# Altium schematic symbol library jlcpcb_2025_04_capacitors_extended_0402.schlib: 3594 symbols (part 11 of 20) (continued)
## CQ0402BRNPO9BN1R9
designator C?  Capacitance: 1.9pF  (hidden comment: *)
Capacitor, Ceramic (MLCC), 1.9pF, 50V, NP0, SMD 0402; Manufacturer: YAGEO; Manufacturer Part Number: CQ0402BRNPO9BN1R9; Package Size: 0402; JLCPCB Basic Part: No; JLCPCB Part Number: C1855155; Supplier 1: LCSC; Category: Capacitors - MLCC; Supplier Part Number 1: C1855155; Voltage Rating: 50V; Temperature Coefficient: NP0; RoHS: Yes; ComponentLink1Description: Datasheet; ComponentLink1URL: https://wmsc.lcsc.com/wmsc/upload/file/pdf/v2/lcsc/2201271230_YAGEO-CQ0402BRNPO9BN1R9_C1855155.pdf; ComponentLink2Description: JLCPCB Part URL; ComponentLink2URL: https://jlcpcb.com/partdetail/C1855155; ComponentLink3Description: LCSC Part URL; ComponentLink3URL: https://lcsc.com/product-detail/Multilayer-Ceramic-Capacitors-MLCC---SMD-SMT_YAGEO-YAGEO-CQ0402BRNPO9BN1R9_C1855155.html
footprint CAP-0402 (0402 (1005M) Capacitor)
pins: 1, 2

## CQ0402BRNPO9BN2R1
designator C?  Capacitance: 2.1pF  (hidden comment: *)
Capacitor, Ceramic (MLCC), 2.1pF, 50V, C0G, SMD 0402; Manufacturer: YAGEO; Manufacturer Part Number: CQ0402BRNPO9BN2R1; Package Size: 0402; JLCPCB Basic Part: No; JLCPCB Part Number: C3891310; Supplier 1: LCSC; Category: Capacitors - MLCC; Supplier Part Number 1: C3891310; Voltage Rating: 50V; Temperature Coefficient: C0G; RoHS: Yes; ComponentLink1Description: Datasheet; ComponentLink1URL: https://wmsc.lcsc.com/wmsc/upload/file/pdf/v2/lcsc/2311211124_YAGEO-CQ0402BRNPO9BN2R1_C3891310.pdf; ComponentLink2Description: JLCPCB Part URL; ComponentLink2URL: https://jlcpcb.com/partdetail/C3891310; ComponentLink3Description: LCSC Part URL; ComponentLink3URL: https://lcsc.com/product-detail/Multilayer-Ceramic-Capacitors-MLCC---SMD-SMT_YAGEO-YAGEO-CQ0402BRNPO9BN2R1_C3891310.html
footprint CAP-0402 (0402 (1005M) Capacitor)
pins: 1, 2

## CQ0402BRNPO9BN2R2
designator C?  Capacitance: 2.2pF  (hidden comment: *)
Capacitor, Ceramic (MLCC), 2.2pF, 50V, NP0, SMD 0402; Manufacturer: YAGEO; Manufacturer Part Number: CQ0402BRNPO9BN2R2; Package Size: 0402; JLCPCB Basic Part: No; JLCPCB Part Number: C577375; Supplier 1: LCSC; Category: Capacitors - MLCC; Supplier Part Number 1: C577375; Voltage Rating: 50V; Temperature Coefficient: NP0; RoHS: Yes; ComponentLink1Description: Datasheet; ComponentLink1URL: https://wmsc.lcsc.com/wmsc/upload/file/pdf/v2/lcsc/2201041830_YAGEO-CQ0402BRNPO9BN2R2_C577375.pdf; ComponentLink2Description: JLCPCB Part URL; ComponentLink2URL: https://jlcpcb.com/partdetail/C577375; ComponentLink3Description: LCSC Part URL; ComponentLink3URL: https://lcsc.com/product-detail/Multilayer-Ceramic-Capacitors-MLCC---SMD-SMT_YAGEO-YAGEO-CQ0402BRNPO9BN2R2_C577375.html
footprint CAP-0402 (0402 (1005M) Capacitor)
pins: 1, 2

## CQ0402BRNPO9BN2R3
designator C?  Capacitance: 2.3pF  (hidden comment: *)
Capacitor, Ceramic (MLCC), 2.3pF, 50V, C0G, SMD 0402; Manufacturer: YAGEO; Manufacturer Part Number: CQ0402BRNPO9BN2R3; Package Size: 0402; JLCPCB Basic Part: No; JLCPCB Part Number: C3842756; Supplier 1: LCSC; Category: Capacitors - MLCC; Supplier Part Number 1: C3842756; Voltage Rating: 50V; Temperature Coefficient: C0G; RoHS: Yes; ComponentLink1Description: Datasheet; ComponentLink1URL: https://wmsc.lcsc.com/wmsc/upload/file/pdf/v2/lcsc/2311211124_YAGEO-CQ0402BRNPO9BN2R3_C3842756.pdf; ComponentLink2Description: JLCPCB Part URL; ComponentLink2URL: https://jlcpcb.com/partdetail/C3842756; ComponentLink3Description: LCSC Part URL; ComponentLink3URL: https://lcsc.com/product-detail/Multilayer-Ceramic-Capacitors-MLCC---SMD-SMT_YAGEO-YAGEO-CQ0402BRNPO9BN2R3_C3842756.html
footprint CAP-0402 (0402 (1005M) Capacitor)
pins: 1, 2

## CQ0402BRNPO9BN2R4
designator C?  Capacitance: 2.4pF  (hidden comment: *)
Capacitor, Ceramic (MLCC), 2.4pF, 50V, NP0, SMD 0402; Manufacturer: YAGEO; Manufacturer Part Number: CQ0402BRNPO9BN2R4; Package Size: 0402; JLCPCB Basic Part: No; JLCPCB Part Number: C577376; Supplier 1: LCSC; Category: Capacitors - MLCC; Supplier Part Number 1: C577376; Voltage Rating: 50V; Temperature Coefficient: NP0; RoHS: Yes; ComponentLink1Description: Datasheet; ComponentLink1URL: https://wmsc.lcsc.com/wmsc/upload/file/pdf/v2/lcsc/2207011200_YAGEO-CQ0402BRNPO9BN2R4_C577376.pdf; ComponentLink2Description: JLCPCB Part URL; ComponentLink2URL: https://jlcpcb.com/partdetail/C577376; ComponentLink3Description: LCSC Part URL; ComponentLink3URL: https://lcsc.com/product-detail/Multilayer-Ceramic-Capacitors-MLCC---SMD-SMT_YAGEO-YAGEO-CQ0402BRNPO9BN2R4_C577376.html
footprint CAP-0402 (0402 (1005M) Capacitor)
pins: 1, 2

## CQ0402BRNPO9BN2R6
designator C?  Capacitance: 2.6pF  (hidden comment: *)
Capacitor, Ceramic (MLCC), 2.6pF, 50V, NP0, SMD 0402; Manufacturer: YAGEO; Manufacturer Part Number: CQ0402BRNPO9BN2R6; Package Size: 0402; JLCPCB Basic Part: No; JLCPCB Part Number: C1855279; Supplier 1: LCSC; Category: Capacitors - MLCC; Supplier Part Number 1: C1855279; Voltage Rating: 50V; Temperature Coefficient: NP0; RoHS: Yes; ComponentLink1Description: Datasheet; ComponentLink1URL: https://wmsc.lcsc.com/wmsc/upload/file/pdf/v2/lcsc/2201271230_YAGEO-CQ0402BRNPO9BN2R6_C1855279.pdf; ComponentLink2Description: JLCPCB Part URL; ComponentLink2URL: https://jlcpcb.com/partdetail/C1855279; ComponentLink3Description: LCSC Part URL; ComponentLink3URL: https://lcsc.com/product-detail/Multilayer-Ceramic-Capacitors-MLCC---SMD-SMT_YAGEO-YAGEO-CQ0402BRNPO9BN2R6_C1855279.html
footprint CAP-0402 (0402 (1005M) Capacitor)
pins: 1, 2

## CQ0402BRNPO9BN3R0
designator C?  Capacitance: 3pF  (hidden comment: *)
Capacitor, Ceramic (MLCC), 3pF, 50V, NP0, SMD 0402; Manufacturer: YAGEO; Manufacturer Part Number: CQ0402BRNPO9BN3R0; Package Size: 0402; JLCPCB Basic Part: No; JLCPCB Part Number: C577378; Supplier 1: LCSC; Category: Capacitors - MLCC; Supplier Part Number 1: C577378; Voltage Rating: 50V; Temperature Coefficient: NP0; RoHS: Yes; ComponentLink1Description: Datasheet; ComponentLink1URL: https://wmsc.lcsc.com/wmsc/upload/file/pdf/v2/lcsc/2203221230_YAGEO-CQ0402BRNPO9BN3R0_C577378.pdf; ComponentLink2Description: JLCPCB Part URL; ComponentLink2URL: https://jlcpcb.com/partdetail/C577378; ComponentLink3Description: LCSC Part URL; ComponentLink3URL: https://lcsc.com/product-detail/Multilayer-Ceramic-Capacitors-MLCC---SMD-SMT_YAGEO-YAGEO-CQ0402BRNPO9BN3R0_C577378.html
footprint CAP-0402 (0402 (1005M) Capacitor)
pins: 1, 2

## CQ0402BRNPO9BN3R1
designator C?  Capacitance: 3.1pF  (hidden comment: *)
Capacitor, Ceramic (MLCC), 3.1pF, 50V, NP0, SMD 0402; Manufacturer: YAGEO; Manufacturer Part Number: CQ0402BRNPO9BN3R1; Package Size: 0402; JLCPCB Basic Part: No; JLCPCB Part Number: C1855283; Supplier 1: LCSC; Category: Capacitors - MLCC; Supplier Part Number 1: C1855283; Voltage Rating: 50V; Temperature Coefficient: NP0; RoHS: Yes; ComponentLink1Description: Datasheet; ComponentLink1URL: https://wmsc.lcsc.com/wmsc/upload/file/pdf/v2/lcsc/2201271230_YAGEO-CQ0402BRNPO9BN3R1_C1855283.pdf; ComponentLink2Description: JLCPCB Part URL; ComponentLink2URL: https://jlcpcb.com/partdetail/C1855283; ComponentLink3Description: LCSC Part URL; ComponentLink3URL: https://lcsc.com/product-detail/Multilayer-Ceramic-Capacitors-MLCC---SMD-SMT_YAGEO-YAGEO-CQ0402BRNPO9BN3R1_C1855283.html
footprint CAP-0402 (0402 (1005M) Capacitor)
pins: 1, 2

## CQ0402BRNPO9BN3R3
designator C?  Capacitance: 3.3pF  (hidden comment: *)
Capacitor, Ceramic (MLCC), 3.3pF, 50V, NP0, SMD 0402; Manufacturer: YAGEO; Manufacturer Part Number: CQ0402BRNPO9BN3R3; Package Size: 0402; JLCPCB Basic Part: No; JLCPCB Part Number: C326071; Supplier 1: LCSC; Category: Capacitors - MLCC; Supplier Part Number 1: C326071; Voltage Rating: 50V; Temperature Coefficient: NP0; RoHS: Yes; ComponentLink1Description: Datasheet; ComponentLink1URL: https://wmsc.lcsc.com/wmsc/upload/file/pdf/v2/lcsc/1811070918_YAGEO-CQ0402BRNPO9BN3R3_C326071.pdf; ComponentLink2Description: JLCPCB Part URL; ComponentLink2URL: https://jlcpcb.com/partdetail/C326071; ComponentLink3Description: LCSC Part URL; ComponentLink3URL: https://lcsc.com/product-detail/Multilayer-Ceramic-Capacitors-MLCC---SMD-SMT_YAGEO-YAGEO-CQ0402BRNPO9BN3R3_C326071.html
footprint CAP-0402 (0402 (1005M) Capacitor)
pins: 1, 2

## CQ0402BRNPO9BN3R4
designator C?  Capacitance: 3.4pF  (hidden comment: *)
Capacitor, Ceramic (MLCC), 3.4pF, 50V, C0G, SMD 0402; Manufacturer: YAGEO; Manufacturer Part Number: CQ0402BRNPO9BN3R4; Package Size: 0402; JLCPCB Basic Part: No; JLCPCB Part Number: C3903353; Supplier 1: LCSC; Category: Capacitors - MLCC; Supplier Part Number 1: C3903353; Voltage Rating: 50V; Temperature Coefficient: C0G; RoHS: Yes; ComponentLink1Description: Datasheet; ComponentLink1URL: https://wmsc.lcsc.com/wmsc/upload/file/pdf/v2/lcsc/2311211124_YAGEO-CQ0402BRNPO9BN3R4_C3903353.pdf; ComponentLink2Description: JLCPCB Part URL; ComponentLink2URL: https://jlcpcb.com/partdetail/C3903353; ComponentLink3Description: LCSC Part URL; ComponentLink3URL: https://lcsc.com/product-detail/Multilayer-Ceramic-Capacitors-MLCC---SMD-SMT_YAGEO-YAGEO-CQ0402BRNPO9BN3R4_C3903353.html
footprint CAP-0402 (0402 (1005M) Capacitor)
pins: 1, 2

## CQ0402BRNPO9BN3R9
designator C?  Capacitance: 3.9pF  (hidden comment: *)
Capacitor, Ceramic (MLCC), 3.9pF, 50V, NP0, SMD 0402; Manufacturer: YAGEO; Manufacturer Part Number: CQ0402BRNPO9BN3R9; Package Size: 0402; JLCPCB Basic Part: No; JLCPCB Part Number: C577379; Supplier 1: LCSC; Category: Capacitors - MLCC; Supplier Part Number 1: C577379; Voltage Rating: 50V; Temperature Coefficient: NP0; RoHS: Yes; ComponentLink1Description: Datasheet; ComponentLink1URL: https://wmsc.lcsc.com/wmsc/upload/file/pdf/v2/lcsc/2203081130_YAGEO-CQ0402BRNPO9BN3R9_C577379.pdf; ComponentLink2Description: JLCPCB Part URL; ComponentLink2URL: https://jlcpcb.com/partdetail/C577379; ComponentLink3Description: LCSC Part URL; ComponentLink3URL: https://lcsc.com/product-detail/Multilayer-Ceramic-Capacitors-MLCC---SMD-SMT_YAGEO-YAGEO-CQ0402BRNPO9BN3R9_C577379.html
footprint CAP-0402 (0402 (1005M) Capacitor)
pins: 1, 2

## CQ0402BRNPO9BN4R2
designator C?  Capacitance: 4.2pF  (hidden comment: *)
Capacitor, Ceramic (MLCC), 4.2pF, 50V, NP0, SMD 0402; Manufacturer: YAGEO; Manufacturer Part Number: CQ0402BRNPO9BN4R2; Package Size: 0402; JLCPCB Basic Part: No; JLCPCB Part Number: C1855289; Supplier 1: LCSC; Category: Capacitors - MLCC; Supplier Part Number 1: C1855289; Voltage Rating: 50V; Temperature Coefficient: NP0; RoHS: Yes; ComponentLink1Description: Datasheet; ComponentLink1URL: https://wmsc.lcsc.com/wmsc/upload/file/pdf/v2/lcsc/2201271230_YAGEO-CQ0402BRNPO9BN4R2_C1855289.pdf; ComponentLink2Description: JLCPCB Part URL; ComponentLink2URL: https://jlcpcb.com/partdetail/C1855289; ComponentLink3Description: LCSC Part URL; ComponentLink3URL: https://lcsc.com/product-detail/Multilayer-Ceramic-Capacitors-MLCC---SMD-SMT_YAGEO-YAGEO-CQ0402BRNPO9BN4R2_C1855289.html
footprint CAP-0402 (0402 (1005M) Capacitor)
pins: 1, 2

## CQ0402BRNPO9BN4R5
designator C?  Capacitance: 4.5pF  (hidden comment: *)
Capacitor, Ceramic (MLCC), 4.5pF, 50V, NP0, SMD 0402; Manufacturer: YAGEO; Manufacturer Part Number: CQ0402BRNPO9BN4R5; Package Size: 0402; JLCPCB Basic Part: No; JLCPCB Part Number: C1855284; Supplier 1: LCSC; Category: Capacitors - MLCC; Supplier Part Number 1: C1855284; Voltage Rating: 50V; Temperature Coefficient: NP0; RoHS: Yes; ComponentLink1Description: Datasheet; ComponentLink1URL: https://wmsc.lcsc.com/wmsc/upload/file/pdf/v2/lcsc/2201271230_YAGEO-CQ0402BRNPO9BN4R5_C1855284.pdf; ComponentLink2Description: JLCPCB Part URL; ComponentLink2URL: https://jlcpcb.com/partdetail/C1855284; ComponentLink3Description: LCSC Part URL; ComponentLink3URL: https://lcsc.com/product-detail/Multilayer-Ceramic-Capacitors-MLCC---SMD-SMT_YAGEO-YAGEO-CQ0402BRNPO9BN4R5_C1855284.html
footprint CAP-0402 (0402 (1005M) Capacitor)
pins: 1, 2

## CQ0402BRNPO9BN4R9
designator C?  Capacitance: 4.9pF  (hidden comment: *)
Capacitor, Ceramic (MLCC), 4.9pF, 50V, NP0, SMD 0402; Manufacturer: YAGEO; Manufacturer Part Number: CQ0402BRNPO9BN4R9; Package Size: 0402; JLCPCB Basic Part: No; JLCPCB Part Number: C1855285; Supplier 1: LCSC; Category: Capacitors - MLCC; Supplier Part Number 1: C1855285; Voltage Rating: 50V; Temperature Coefficient: NP0; RoHS: Yes; ComponentLink1Description: Datasheet; ComponentLink1URL: https://wmsc.lcsc.com/wmsc/upload/file/pdf/v2/lcsc/2201271230_YAGEO-CQ0402BRNPO9BN4R9_C1855285.pdf; ComponentLink2Description: JLCPCB Part URL; ComponentLink2URL: https://jlcpcb.com/partdetail/C1855285; ComponentLink3Description: LCSC Part URL; ComponentLink3URL: https://lcsc.com/product-detail/Multilayer-Ceramic-Capacitors-MLCC---SMD-SMT_YAGEO-YAGEO-CQ0402BRNPO9BN4R9_C1855285.html
footprint CAP-0402 (0402 (1005M) Capacitor)
pins: 1, 2

## CQ0402BRNPO9BN5R0
designator C?  Capacitance: 5pF  (hidden comment: *)
Capacitor, Ceramic (MLCC), 5pF, null, NP0, SMD 0402; Manufacturer: YAGEO; Manufacturer Part Number: CQ0402BRNPO9BN5R0; Package Size: 0402; JLCPCB Basic Part: No; JLCPCB Part Number: C577383; Supplier 1: LCSC; Category: Capacitors - MLCC; Supplier Part Number 1: C577383; Voltage Rating: null; Temperature Coefficient: NP0; RoHS: Yes; ComponentLink1Description: Datasheet; ComponentLink1URL: https://wmsc.lcsc.com/wmsc/upload/file/pdf/v2/lcsc/2211211800_YAGEO-CQ0402BRNPO9BN5R0_C577383.pdf; ComponentLink2Description: JLCPCB Part URL; ComponentLink2URL: https://jlcpcb.com/partdetail/C577383; ComponentLink3Description: LCSC Part URL; ComponentLink3URL: https://lcsc.com/product-detail/Multilayer-Ceramic-Capacitors-MLCC---SMD-SMT_YAGEO-YAGEO-CQ0402BRNPO9BN5R0_C577383.html
footprint CAP-0402 (0402 (1005M) Capacitor)
pins: 1, 2

## CQ0402BRNPO9BNR10
designator C?  Capacitance: 0.1pF  (hidden comment: *)
Capacitor, Ceramic (MLCC), 0.1pF, 50V, NP0, SMD 0402; Manufacturer: YAGEO; Manufacturer Part Number: CQ0402BRNPO9BNR10; Package Size: 0402; JLCPCB Basic Part: No; JLCPCB Part Number: C1855094; Supplier 1: LCSC; Category: Capacitors - MLCC; Supplier Part Number 1: C1855094; Voltage Rating: 50V; Temperature Coefficient: NP0; RoHS: Yes; ComponentLink1Description: Datasheet; ComponentLink1URL: https://wmsc.lcsc.com/wmsc/upload/file/pdf/v2/lcsc/2201271230_YAGEO-CQ0402BRNPO9BNR10_C1855094.pdf; ComponentLink2Description: JLCPCB Part URL; ComponentLink2URL: https://jlcpcb.com/partdetail/C1855094; ComponentLink3Description: LCSC Part URL; ComponentLink3URL: https://lcsc.com/product-detail/Multilayer-Ceramic-Capacitors-MLCC---SMD-SMT_YAGEO-YAGEO-CQ0402BRNPO9BNR10_C1855094.html
footprint CAP-0402 (0402 (1005M) Capacitor)
pins: 1, 2

## CQ0402BRNPO9BNR30
designator C?  Capacitance: 0.3pF  (hidden comment: *)
Capacitor, Ceramic (MLCC), 0.3pF, 50V, NP0, SMD 0402; Manufacturer: YAGEO; Manufacturer Part Number: CQ0402BRNPO9BNR30; Package Size: 0402; JLCPCB Basic Part: No; JLCPCB Part Number: C723570; Supplier 1: LCSC; Category: Capacitors - MLCC; Supplier Part Number 1: C723570; Voltage Rating: 50V; Temperature Coefficient: NP0; RoHS: Yes; ComponentLink1Description: Datasheet; ComponentLink1URL: https://wmsc.lcsc.com/wmsc/upload/file/pdf/v2/lcsc/2008171333_YAGEO-CQ0402BRNPO9BNR30_C723570.pdf; ComponentLink2Description: JLCPCB Part URL; ComponentLink2URL: https://jlcpcb.com/partdetail/C723570; ComponentLink3Description: LCSC Part URL; ComponentLink3URL: https://lcsc.com/product-detail/Multilayer-Ceramic-Capacitors-MLCC---SMD-SMT_YAGEO-YAGEO-CQ0402BRNPO9BNR30_C723570.html
footprint CAP-0402 (0402 (1005M) Capacitor)
pins: 1, 2

## CQ0402BRNPO9BNR40
designator C?  Capacitance: 0.4pF  (hidden comment: *)
Capacitor, Ceramic (MLCC), 0.4pF, 50V, NP0, SMD 0402; Manufacturer: YAGEO; Manufacturer Part Number: CQ0402BRNPO9BNR40; Package Size: 0402; JLCPCB Basic Part: No; JLCPCB Part Number: C1855078; Supplier 1: LCSC; Category: Capacitors - MLCC; Supplier Part Number 1: C1855078; Voltage Rating: 50V; Temperature Coefficient: NP0; RoHS: Yes; ComponentLink1Description: Datasheet; ComponentLink1URL: https://wmsc.lcsc.com/wmsc/upload/file/pdf/v2/lcsc/2201271230_YAGEO-CQ0402BRNPO9BNR40_C1855078.pdf; ComponentLink2Description: JLCPCB Part URL; ComponentLink2URL: https://jlcpcb.com/partdetail/C1855078; ComponentLink3Description: LCSC Part URL; ComponentLink3URL: https://lcsc.com/product-detail/Multilayer-Ceramic-Capacitors-MLCC---SMD-SMT_YAGEO-YAGEO-CQ0402BRNPO9BNR40_C1855078.html
footprint CAP-0402 (0402 (1005M) Capacitor)
pins: 1, 2

## CQ0402BRNPO9BNR70
designator C?  Capacitance: 0.7pF  (hidden comment: *)
Capacitor, Ceramic (MLCC), 0.7pF, 50V, NP0, SMD 0402; Manufacturer: YAGEO; Manufacturer Part Number: CQ0402BRNPO9BNR70; Package Size: 0402; JLCPCB Basic Part: No; JLCPCB Part Number: C469633; Supplier 1: LCSC; Category: Capacitors - MLCC; Supplier Part Number 1: C469633; Voltage Rating: 50V; Temperature Coefficient: NP0; RoHS: Yes; ComponentLink1Description: Datasheet; ComponentLink1URL: https://wmsc.lcsc.com/wmsc/upload/file/pdf/v2/lcsc/2311211124_YAGEO-CQ0402BRNPO9BNR70_C469633.pdf; ComponentLink2Description: JLCPCB Part URL; ComponentLink2URL: https://jlcpcb.com/partdetail/C469633; ComponentLink3Description: LCSC Part URL; ComponentLink3URL: https://lcsc.com/product-detail/Multilayer-Ceramic-Capacitors-MLCC---SMD-SMT_YAGEO-YAGEO-CQ0402BRNPO9BNR70_C469633.html
footprint CAP-0402 (0402 (1005M) Capacitor)
pins: 1, 2

## CQ0402BRNPO9BNR75
designator C?  Capacitance: 0.75pF  (hidden comment: *)
Capacitor, Ceramic (MLCC), 0.75pF, 50V, NP0, SMD 0402; Manufacturer: YAGEO; Manufacturer Part Number: CQ0402BRNPO9BNR75; Package Size: 0402; JLCPCB Basic Part: No; JLCPCB Part Number: C1855052; Supplier 1: LCSC; Category: Capacitors - MLCC; Supplier Part Number 1: C1855052; Voltage Rating: 50V; Temperature Coefficient: NP0; RoHS: Yes; ComponentLink1Description: Datasheet; ComponentLink1URL: https://wmsc.lcsc.com/wmsc/upload/file/pdf/v2/lcsc/2201271230_YAGEO-CQ0402BRNPO9BNR75_C1855052.pdf; ComponentLink2Description: JLCPCB Part URL; ComponentLink2URL: https://jlcpcb.com/partdetail/C1855052; ComponentLink3Description: LCSC Part URL; ComponentLink3URL: https://lcsc.com/product-detail/Multilayer-Ceramic-Capacitors-MLCC---SMD-SMT_YAGEO-YAGEO-CQ0402BRNPO9BNR75_C1855052.html
footprint CAP-0402 (0402 (1005M) Capacitor)
pins: 1, 2

## CQ0402BRNPO9BNR80
designator C?  Capacitance: 0.8pF  (hidden comment: *)
Capacitor, Ceramic (MLCC), 0.8pF, 50V, NP0, SMD 0402; Manufacturer: YAGEO; Manufacturer Part Number: CQ0402BRNPO9BNR80; Package Size: 0402; JLCPCB Basic Part: No; JLCPCB Part Number: C577390; Supplier 1: LCSC; Category: Capacitors - MLCC; Supplier Part Number 1: C577390; Voltage Rating: 50V; Temperature Coefficient: NP0; RoHS: Yes; ComponentLink1Description: Datasheet; ComponentLink1URL: https://wmsc.lcsc.com/wmsc/upload/file/pdf/v2/lcsc/2303091230_YAGEO-CQ0402BRNPO9BNR80_C577390.pdf; ComponentLink2Description: JLCPCB Part URL; ComponentLink2URL: https://jlcpcb.com/partdetail/C577390; ComponentLink3Description: LCSC Part URL; ComponentLink3URL: https://lcsc.com/product-detail/Multilayer-Ceramic-Capacitors-MLCC---SMD-SMT_YAGEO-YAGEO-CQ0402BRNPO9BNR80_C577390.html
footprint CAP-0402 (0402 (1005M) Capacitor)
pins: 1, 2

## CQ0402BRNPO9BNR90
designator C?  Capacitance: 0.9pF  (hidden comment: *)
Capacitor, Ceramic (MLCC), 0.9pF, 50V, NP0, SMD 0402; Manufacturer: YAGEO; Manufacturer Part Number: CQ0402BRNPO9BNR90; Package Size: 0402; JLCPCB Basic Part: No; JLCPCB Part Number: C577391; Supplier 1: LCSC; Category: Capacitors - MLCC; Supplier Part Number 1: C577391; Voltage Rating: 50V; Temperature Coefficient: NP0; RoHS: Yes; ComponentLink1Description: Datasheet; ComponentLink1URL: https://wmsc.lcsc.com/wmsc/upload/file/pdf/v2/lcsc/2008171234_YAGEO-CQ0402BRNPO9BNR90_C577391.pdf; ComponentLink2Description: JLCPCB Part URL; ComponentLink2URL: https://jlcpcb.com/partdetail/C577391; ComponentLink3Description: LCSC Part URL; ComponentLink3URL: https://lcsc.com/product-detail/Multilayer-Ceramic-Capacitors-MLCC---SMD-SMT_YAGEO-YAGEO-CQ0402BRNPO9BNR90_C577391.html
footprint CAP-0402 (0402 (1005M) Capacitor)
pins: 1, 2

## CQ0402CRNPO9BN2R2
designator C?  Capacitance: 2.2pF  (hidden comment: *)
Capacitor, Ceramic (MLCC), 2.2pF, 50V, NP0, SMD 0402; Manufacturer: YAGEO; Manufacturer Part Number: CQ0402CRNPO9BN2R2; Package Size: 0402; JLCPCB Basic Part: No; JLCPCB Part Number: C389106; Supplier 1: LCSC; Category: Capacitors - MLCC; Supplier Part Number 1: C389106; Voltage Rating: 50V; Temperature Coefficient: NP0; RoHS: Yes; ComponentLink1Description: Datasheet; ComponentLink1URL: https://wmsc.lcsc.com/wmsc/upload/file/pdf/v2/lcsc/1912111437_YAGEO-CQ0402CRNPO9BN2R2_C389106.pdf; ComponentLink2Description: JLCPCB Part URL; ComponentLink2URL: https://jlcpcb.com/partdetail/C389106; ComponentLink3Description: LCSC Part URL; ComponentLink3URL: https://lcsc.com/product-detail/Multilayer-Ceramic-Capacitors-MLCC---SMD-SMT_YAGEO-YAGEO-CQ0402CRNPO9BN2R2_C389106.html
footprint CAP-0402 (0402 (1005M) Capacitor)
pins: 1, 2

## CQ0402CRNPO9BN4R3
designator C?  Capacitance: 4.3pF  (hidden comment: *)
Capacitor, Ceramic (MLCC), 4.3pF, 50V, NP0, SMD 0402; Manufacturer: YAGEO; Manufacturer Part Number: CQ0402CRNPO9BN4R3; Package Size: 0402; JLCPCB Basic Part: No; JLCPCB Part Number: C1855164; Supplier 1: LCSC; Category: Capacitors - MLCC; Supplier Part Number 1: C1855164; Voltage Rating: 50V; Temperature Coefficient: NP0; RoHS: Yes; ComponentLink1Description: Datasheet; ComponentLink1URL: https://wmsc.lcsc.com/wmsc/upload/file/pdf/v2/lcsc/2201271230_YAGEO-CQ0402CRNPO9BN4R3_C1855164.pdf; ComponentLink2Description: JLCPCB Part URL; ComponentLink2URL: https://jlcpcb.com/partdetail/C1855164; ComponentLink3Description: LCSC Part URL; ComponentLink3URL: https://lcsc.com/product-detail/Multilayer-Ceramic-Capacitors-MLCC---SMD-SMT_YAGEO-YAGEO-CQ0402CRNPO9BN4R3_C1855164.html
footprint CAP-0402 (0402 (1005M) Capacitor)
pins: 1, 2

## CQ0402CRNPO9BN4R7
designator C?  Capacitance: 4.7pF  (hidden comment: *)
Capacitor, Ceramic (MLCC), 4.7pF, 50V, NP0, SMD 0402; Manufacturer: YAGEO; Manufacturer Part Number: CQ0402CRNPO9BN4R7; Package Size: 0402; JLCPCB Basic Part: No; JLCPCB Part Number: C577397; Supplier 1: LCSC; Category: Capacitors - MLCC; Supplier Part Number 1: C577397; Voltage Rating: 50V; Temperature Coefficient: NP0; RoHS: Yes; ComponentLink1Description: Datasheet; ComponentLink1URL: https://wmsc.lcsc.com/wmsc/upload/file/pdf/v2/lcsc/2112151830_YAGEO-CQ0402CRNPO9BN4R7_C577397.pdf; ComponentLink2Description: JLCPCB Part URL; ComponentLink2URL: https://jlcpcb.com/partdetail/C577397; ComponentLink3Description: LCSC Part URL; ComponentLink3URL: https://lcsc.com/product-detail/Multilayer-Ceramic-Capacitors-MLCC---SMD-SMT_YAGEO-YAGEO-CQ0402CRNPO9BN4R7_C577397.html
footprint CAP-0402 (0402 (1005M) Capacitor)
pins: 1, 2

## CQ0402CRNPO9BN6R5
designator C?  Capacitance: 6.5pF  (hidden comment: *)
Capacitor, Ceramic (MLCC), 6.5pF, 50V, NP0, SMD 0402; Manufacturer: YAGEO; Manufacturer Part Number: CQ0402CRNPO9BN6R5; Package Size: 0402; JLCPCB Basic Part: No; JLCPCB Part Number: C1855176; Supplier 1: LCSC; Category: Capacitors - MLCC; Supplier Part Number 1: C1855176; Voltage Rating: 50V; Temperature Coefficient: NP0; RoHS: Yes; ComponentLink1Description: Datasheet; ComponentLink1URL: https://wmsc.lcsc.com/wmsc/upload/file/pdf/v2/lcsc/2201271230_YAGEO-CQ0402CRNPO9BN6R5_C1855176.pdf; ComponentLink2Description: JLCPCB Part URL; ComponentLink2URL: https://jlcpcb.com/partdetail/C1855176; ComponentLink3Description: LCSC Part URL; ComponentLink3URL: https://lcsc.com/product-detail/Multilayer-Ceramic-Capacitors-MLCC---SMD-SMT_YAGEO-YAGEO-CQ0402CRNPO9BN6R5_C1855176.html
footprint CAP-0402 (0402 (1005M) Capacitor)
pins: 1, 2

## CQ0402CRNPO9BN6R8
designator C?  Capacitance: 6.8pF  (hidden comment: *)
Capacitor, Ceramic (MLCC), 6.8pF, 50V, NP0, SMD 0402; Manufacturer: YAGEO; Manufacturer Part Number: CQ0402CRNPO9BN6R8; Package Size: 0402; JLCPCB Basic Part: No; JLCPCB Part Number: C326072; Supplier 1: LCSC; Category: Capacitors - MLCC; Supplier Part Number 1: C326072; Voltage Rating: 50V; Temperature Coefficient: NP0; RoHS: Yes; ComponentLink1Description: Datasheet; ComponentLink1URL: https://wmsc.lcsc.com/wmsc/upload/file/pdf/v2/lcsc/1811070918_YAGEO-CQ0402CRNPO9BN6R8_C326072.pdf; ComponentLink2Description: JLCPCB Part URL; ComponentLink2URL: https://jlcpcb.com/partdetail/C326072; ComponentLink3Description: LCSC Part URL; ComponentLink3URL: https://lcsc.com/product-detail/Multilayer-Ceramic-Capacitors-MLCC---SMD-SMT_YAGEO-YAGEO-CQ0402CRNPO9BN6R8_C326072.html
footprint CAP-0402 (0402 (1005M) Capacitor)
pins: 1, 2

## CQ0402FRNPO9BN100
designator C?  Capacitance: 10pF  (hidden comment: *)
Capacitor, Ceramic (MLCC), 10pF, ±1%, 50V, NP0, ±1%, SMD 0402; Manufacturer: YAGEO; Manufacturer Part Number: CQ0402FRNPO9BN100; Package Size: 0402; JLCPCB Basic Part: No; JLCPCB Part Number: C2237317; Supplier 1: LCSC; Category: Capacitors - MLCC; Supplier Part Number 1: C2237317; Tolerance: ±1%; Voltage Rating: 50V; Temperature Coefficient: NP0; RoHS: Yes; ComponentLink1Description: Datasheet; ComponentLink1URL: https://wmsc.lcsc.com/wmsc/upload/file/pdf/v2/lcsc/2304140030_YAGEO-CQ0402FRNPO9BN100_C2237317.pdf; ComponentLink2Description: JLCPCB Part URL; ComponentLink2URL: https://jlcpcb.com/partdetail/C2237317; ComponentLink3Description: LCSC Part URL; ComponentLink3URL: https://lcsc.com/product-detail/Multilayer-Ceramic-Capacitors-MLCC---SMD-SMT_YAGEO-YAGEO-CQ0402FRNPO9BN100_C2237317.html
footprint CAP-0402 (0402 (1005M) Capacitor)
pins: 1, 2

## CQ0402FRNPO9BN180
designator C?  Capacitance: 18pF  (hidden comment: *)
Capacitor, Ceramic (MLCC), 18pF, ±1%, 50V, NP0, ±1%, SMD 0402; Manufacturer: YAGEO; Manufacturer Part Number: CQ0402FRNPO9BN180; Package Size: 0402; JLCPCB Basic Part: No; JLCPCB Part Number: C2237257; Supplier 1: LCSC; Category: Capacitors - MLCC; Supplier Part Number 1: C2237257; Tolerance: ±1%; Voltage Rating: 50V; Temperature Coefficient: NP0; RoHS: Yes; ComponentLink1Description: Datasheet; ComponentLink1URL: https://wmsc.lcsc.com/wmsc/upload/file/pdf/v2/lcsc/2304140030_YAGEO-CQ0402FRNPO9BN180_C2237257.pdf; ComponentLink2Description: JLCPCB Part URL; ComponentLink2URL: https://jlcpcb.com/partdetail/C2237257; ComponentLink3Description: LCSC Part URL; ComponentLink3URL: https://lcsc.com/product-detail/Multilayer-Ceramic-Capacitors-MLCC---SMD-SMT_YAGEO-YAGEO-CQ0402FRNPO9BN180_C2237257.html
footprint CAP-0402 (0402 (1005M) Capacitor)
pins: 1, 2

## CQ0402FRNPO9BN200
designator C?  Capacitance: 20pF  (hidden comment: *)
Capacitor, Ceramic (MLCC), 20pF, ±1%, 50V, NP0, ±1%, SMD 0402; Manufacturer: YAGEO; Manufacturer Part Number: CQ0402FRNPO9BN200; Package Size: 0402; JLCPCB Basic Part: No; JLCPCB Part Number: C1855486; Supplier 1: LCSC; Category: Capacitors - MLCC; Supplier Part Number 1: C1855486; Tolerance: ±1%; Voltage Rating: 50V; Temperature Coefficient: NP0; RoHS: Yes; ComponentLink1Description: Datasheet; ComponentLink1URL: https://wmsc.lcsc.com/wmsc/upload/file/pdf/v2/lcsc/2201271230_YAGEO-CQ0402FRNPO9BN200_C1855486.pdf; ComponentLink2Description: JLCPCB Part URL; ComponentLink2URL: https://jlcpcb.com/partdetail/C1855486; ComponentLink3Description: LCSC Part URL; ComponentLink3URL: https://lcsc.com/product-detail/Multilayer-Ceramic-Capacitors-MLCC---SMD-SMT_YAGEO-YAGEO-CQ0402FRNPO9BN200_C1855486.html
footprint CAP-0402 (0402 (1005M) Capacitor)
pins: 1, 2

## CQ0402FRNPO9BN390
designator C?  Capacitance: 39pF  (hidden comment: *)
Capacitor, Ceramic (MLCC), 39pF, ±1%, 50V, C0G, ±1%, SMD 0402; Manufacturer: YAGEO; Manufacturer Part Number: CQ0402FRNPO9BN390; Package Size: 0402; JLCPCB Basic Part: No; JLCPCB Part Number: C3839587; Supplier 1: LCSC; Category: Capacitors - MLCC; Supplier Part Number 1: C3839587; Tolerance: ±1%; Voltage Rating: 50V; Temperature Coefficient: C0G; RoHS: Yes; ComponentLink1Description: Datasheet; ComponentLink1URL: https://wmsc.lcsc.com/wmsc/upload/file/pdf/v2/lcsc/2311211124_YAGEO-CQ0402FRNPO9BN390_C3839587.pdf; ComponentLink2Description: JLCPCB Part URL; ComponentLink2URL: https://jlcpcb.com/partdetail/C3839587; ComponentLink3Description: LCSC Part URL; ComponentLink3URL: https://lcsc.com/product-detail/Multilayer-Ceramic-Capacitors-MLCC---SMD-SMT_YAGEO-YAGEO-CQ0402FRNPO9BN390_C3839587.html
footprint CAP-0402 (0402 (1005M) Capacitor)
pins: 1, 2

## CQ0402GRNPO9BN100
designator C?  Capacitance: 10pF  (hidden comment: *)
Capacitor, Ceramic (MLCC), 10pF, ±2%, 50V, NP0, ±2%, SMD 0402; Manufacturer: YAGEO; Manufacturer Part Number: CQ0402GRNPO9BN100; Package Size: 0402; JLCPCB Basic Part: No; JLCPCB Part Number: C469630; Supplier 1: LCSC; Category: Capacitors - MLCC; Supplier Part Number 1: C469630; Tolerance: ±2%; Voltage Rating: 50V; Temperature Coefficient: NP0; RoHS: Yes; ComponentLink1Description: Datasheet; ComponentLink1URL: https://wmsc.lcsc.com/wmsc/upload/file/pdf/v2/lcsc/2311211124_YAGEO-CQ0402GRNPO9BN100_C469630.pdf; ComponentLink2Description: JLCPCB Part URL; ComponentLink2URL: https://jlcpcb.com/partdetail/C469630; ComponentLink3Description: LCSC Part URL; ComponentLink3URL: https://lcsc.com/product-detail/Multilayer-Ceramic-Capacitors-MLCC---SMD-SMT_YAGEO-YAGEO-CQ0402GRNPO9BN100_C469630.html
footprint CAP-0402 (0402 (1005M) Capacitor)
pins: 1, 2

## CQ0402JRNPO9BN100
designator C?  Capacitance: 10pF  (hidden comment: *)
Capacitor, Ceramic (MLCC), 10pF, ±5%, 50V, NP0, ±5%, SMD 0402; Manufacturer: YAGEO; Manufacturer Part Number: CQ0402JRNPO9BN100; Package Size: 0402; JLCPCB Basic Part: No; JLCPCB Part Number: C326073; Supplier 1: LCSC; Category: Capacitors - MLCC; Supplier Part Number 1: C326073; Tolerance: ±5%; Voltage Rating: 50V; Temperature Coefficient: NP0; RoHS: Yes; ComponentLink1Description: Datasheet; ComponentLink1URL: https://wmsc.lcsc.com/wmsc/upload/file/pdf/v2/lcsc/1811031143_YAGEO-CQ0402JRNPO9BN100_C326073.pdf; ComponentLink2Description: JLCPCB Part URL; ComponentLink2URL: https://jlcpcb.com/partdetail/C326073; ComponentLink3Description: LCSC Part URL; ComponentLink3URL: https://lcsc.com/product-detail/Multilayer-Ceramic-Capacitors-MLCC---SMD-SMT_YAGEO-YAGEO-CQ0402JRNPO9BN100_C326073.html
footprint CAP-0402 (0402 (1005M) Capacitor)
pins: 1, 2

## CQ0402JRNPO9BN101
designator C?  Capacitance: 100pF  (hidden comment: *)
Capacitor, Ceramic (MLCC), 100pF, ±5%, 50V, NP0, ±5%, SMD 0402; Manufacturer: YAGEO; Manufacturer Part Number: CQ0402JRNPO9BN101; Package Size: 0402; JLCPCB Basic Part: No; JLCPCB Part Number: C326074; Supplier 1: LCSC; Category: Capacitors - MLCC; Supplier Part Number 1: C326074; Tolerance: ±5%; Voltage Rating: 50V; Temperature Coefficient: NP0; RoHS: Yes; ComponentLink1Description: Datasheet; ComponentLink1URL: https://wmsc.lcsc.com/wmsc/upload/file/pdf/v2/lcsc/1811070918_YAGEO-CQ0402JRNPO9BN101_C326074.pdf; ComponentLink2Description: JLCPCB Part URL; ComponentLink2URL: https://jlcpcb.com/partdetail/C326074; ComponentLink3Description: LCSC Part URL; ComponentLink3URL: https://lcsc.com/product-detail/Multilayer-Ceramic-Capacitors-MLCC---SMD-SMT_YAGEO-YAGEO-CQ0402JRNPO9BN101_C326074.html
footprint CAP-0402 (0402 (1005M) Capacitor)
pins: 1, 2

## CQ0402JRNPO9BN200
designator C?  Capacitance: 20pF  (hidden comment: *)
Capacitor, Ceramic (MLCC), 20pF, ±5%, 50V, NP0, ±5%, SMD 0402; Manufacturer: YAGEO; Manufacturer Part Number: CQ0402JRNPO9BN200; Package Size: 0402; JLCPCB Basic Part: No; JLCPCB Part Number: C2290498; Supplier 1: LCSC; Category: Capacitors - MLCC; Supplier Part Number 1: C2290498; Tolerance: ±5%; Voltage Rating: 50V; Temperature Coefficient: NP0; RoHS: Yes; ComponentLink1Description: Datasheet; ComponentLink1URL: https://wmsc.lcsc.com/wmsc/upload/file/pdf/v2/lcsc/2304140030_YAGEO-CQ0402JRNPO9BN200_C2290498.pdf; ComponentLink2Description: JLCPCB Part URL; ComponentLink2URL: https://jlcpcb.com/partdetail/C2290498; ComponentLink3Description: LCSC Part URL; ComponentLink3URL: https://lcsc.com/product-detail/Multilayer-Ceramic-Capacitors-MLCC---SMD-SMT_YAGEO-YAGEO-CQ0402JRNPO9BN200_C2290498.html
footprint CAP-0402 (0402 (1005M) Capacitor)
pins: 1, 2

## CQ0402JRNPO9BN300
designator C?  Capacitance: 30pF  (hidden comment: *)
Capacitor, Ceramic (MLCC), 30pF, ±5%, 50V, NP0, ±5%, SMD 0402; Manufacturer: YAGEO; Manufacturer Part Number: CQ0402JRNPO9BN300; Package Size: 0402; JLCPCB Basic Part: No; JLCPCB Part Number: C2204609; Supplier 1: LCSC; Category: Capacitors - MLCC; Supplier Part Number 1: C2204609; Tolerance: ±5%; Voltage Rating: 50V; Temperature Coefficient: NP0; RoHS: Yes; ComponentLink1Description: Datasheet; ComponentLink1URL: https://wmsc.lcsc.com/wmsc/upload/file/pdf/v2/lcsc/2304140030_YAGEO-CQ0402JRNPO9BN300_C2204609.pdf; ComponentLink2Description: JLCPCB Part URL; ComponentLink2URL: https://jlcpcb.com/partdetail/C2204609; ComponentLink3Description: LCSC Part URL; ComponentLink3URL: https://lcsc.com/product-detail/Multilayer-Ceramic-Capacitors-MLCC---SMD-SMT_YAGEO-YAGEO-CQ0402JRNPO9BN300_C2204609.html
footprint CAP-0402 (0402 (1005M) Capacitor)
pins: 1, 2

## CQ0402JRNPO9BN330
designator C?  Capacitance: 33pF  (hidden comment: *)
Capacitor, Ceramic (MLCC), 33pF, ±5%, 50V, NP0, ±5%, SMD 0402; Manufacturer: YAGEO; Manufacturer Part Number: CQ0402JRNPO9BN330; Package Size: 0402; JLCPCB Basic Part: No; JLCPCB Part Number: C326075; Supplier 1: LCSC; Category: Capacitors - MLCC; Supplier Part Number 1: C326075; Tolerance: ±5%; Voltage Rating: 50V; Temperature Coefficient: NP0; RoHS: Yes; ComponentLink1Description: Datasheet; ComponentLink1URL: https://wmsc.lcsc.com/wmsc/upload/file/pdf/v2/lcsc/1811070918_YAGEO-CQ0402JRNPO9BN330_C326075.pdf; ComponentLink2Description: JLCPCB Part URL; ComponentLink2URL: https://jlcpcb.com/partdetail/C326075; ComponentLink3Description: LCSC Part URL; ComponentLink3URL: https://lcsc.com/product-detail/Multilayer-Ceramic-Capacitors-MLCC---SMD-SMT_YAGEO-YAGEO-CQ0402JRNPO9BN330_C326075.html
footprint CAP-0402 (0402 (1005M) Capacitor)
pins: 1, 2

## CS0402JRNPO9BN101
designator C?  Capacitance: 100pF  (hidden comment: *)
Capacitor, Ceramic (MLCC), 100pF, ±5%, 50V, NP0, ±5%, SMD 0402; Manufacturer: YAGEO; Manufacturer Part Number: CS0402JRNPO9BN101; Package Size: 0402; JLCPCB Basic Part: No; JLCPCB Part Number: C1855029; Supplier 1: LCSC; Category: Capacitors - MLCC; Supplier Part Number 1: C1855029; Tolerance: ±5%; Voltage Rating: 50V; Temperature Coefficient: NP0; RoHS: Yes; ComponentLink1Description: Datasheet; ComponentLink1URL: https://wmsc.lcsc.com/wmsc/upload/file/pdf/v2/lcsc/2201271200_YAGEO-CS0402JRNPO9BN101_C1855029.pdf; ComponentLink2Description: JLCPCB Part URL; ComponentLink2URL: https://jlcpcb.com/partdetail/C1855029; ComponentLink3Description: LCSC Part URL; ComponentLink3URL: https://lcsc.com/product-detail/Multilayer-Ceramic-Capacitors-MLCC---SMD-SMT_YAGEO-YAGEO-CS0402JRNPO9BN101_C1855029.html
footprint CAP-0402 (0402 (1005M) Capacitor)
pins: 1, 2

## CS0402KRX7R8BB104
designator C?  Capacitance: 100nF  (hidden comment: *)
Capacitor, Ceramic (MLCC), 100nF, ±10%, 25V, X7R, ±10%, SMD 0402; Manufacturer: YAGEO; Manufacturer Part Number: CS0402KRX7R8BB104; Package Size: 0402; JLCPCB Basic Part: No; JLCPCB Part Number: C364376; Supplier 1: LCSC; Category: Capacitors - MLCC; Supplier Part Number 1: C364376; Tolerance: ±10%; Voltage Rating: 25V; Temperature Coefficient: X7R; RoHS: Yes; ComponentLink1Description: Datasheet; ComponentLink1URL: https://wmsc.lcsc.com/wmsc/upload/file/pdf/v2/lcsc/1912111437_YAGEO-CS0402KRX7R8BB104_C364376.pdf; ComponentLink2Description: JLCPCB Part URL; ComponentLink2URL: https://jlcpcb.com/partdetail/C364376; ComponentLink3Description: LCSC Part URL; ComponentLink3URL: https://lcsc.com/product-detail/Multilayer-Ceramic-Capacitors-MLCC---SMD-SMT_YAGEO-YAGEO-CS0402KRX7R8BB104_C364376.html
footprint CAP-0402 (0402 (1005M) Capacitor)
pins: 1, 2

## CS1005X7R104K500NR
designator C?  Capacitance: 100nF  (hidden comment: *)
Capacitor, Ceramic (MLCC), 100nF, ±10%, 50V, ±10%, SMD 0402; Manufacturer: Samwha Capacitor; Manufacturer Part Number: CS1005X7R104K500NR; Package Size: 0402; JLCPCB Basic Part: No; JLCPCB Part Number: C513772; Supplier 1: LCSC; Category: Capacitors - MLCC; Supplier Part Number 1: C513772; Tolerance: ±10%; Voltage Rating: 50V; RoHS: Yes; ComponentLink1Description: Datasheet; ComponentLink1URL: https://wmsc.lcsc.com/wmsc/upload/file/pdf/v2/lcsc/2107272240_Samwha-Capacitor-CS1005X7R104K500NR_C513772.pdf; ComponentLink2Description: JLCPCB Part URL; ComponentLink2URL: https://jlcpcb.com/partdetail/C513772; ComponentLink3Description: LCSC Part URL; ComponentLink3URL: https://lcsc.com/product-detail/Multilayer-Ceramic-Capacitors-MLCC---SMD-SMT_Samwha-Capacitor-Samwha-Capacitor-CS1005X7R104K500NR_C513772.html
footprint CAP-0402 (0402 (1005M) Capacitor)
pins: 1, 2

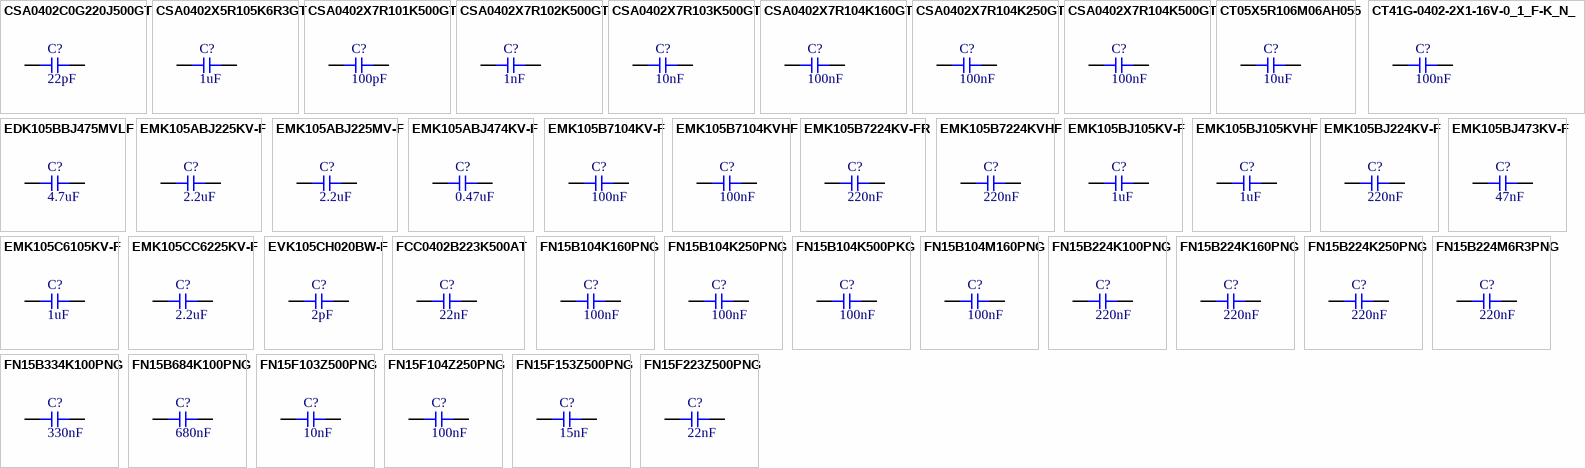
[diagram p51: symbols CSA0402C0G220J500GT to FN15F223Z500PNG]

## CSA0402C0G220J500GT
designator C?  Capacitance: 22pF  (hidden comment: *)
Capacitor, Ceramic (MLCC), 22pF, ±5%, 50V, C0G, ±5%, SMD 0402; Manufacturer: HRE; Manufacturer Part Number: CSA0402C0G220J500GT; Package Size: 0402; JLCPCB Basic Part: No; JLCPCB Part Number: C18220898; Supplier 1: LCSC; Category: Capacitors - MLCC; Supplier Part Number 1: C18220898; Tolerance: ±5%; Voltage Rating: 50V; Temperature Coefficient: C0G; RoHS: Yes; ComponentLink1Description: Datasheet; ComponentLink1URL: https://wmsc.lcsc.com/wmsc/upload/file/pdf/v2/lcsc/2310101733_HRE-CSA0402C0G220J500GT_C18220898.pdf; ComponentLink2Description: JLCPCB Part URL; ComponentLink2URL: https://jlcpcb.com/partdetail/C18220898; ComponentLink3Description: LCSC Part URL; ComponentLink3URL: https://lcsc.com/product-detail/Multilayer-Ceramic-Capacitors-MLCC---SMD-SMT_HRE-HRE-CSA0402C0G220J500GT_C18220898.html
footprint CAP-0402 (0402 (1005M) Capacitor)
pins: 1, 2

## CSA0402X5R105K6R3GT
designator C?  Capacitance: 1uF  (hidden comment: *)
Capacitor, Ceramic (MLCC), 1uF, ±10%, 6.3V, X5R, ±10%, SMD 0402; Manufacturer: HRE; Manufacturer Part Number: CSA0402X5R105K6R3GT; Package Size: 0402; JLCPCB Basic Part: No; JLCPCB Part Number: C3012378; Supplier 1: LCSC; Category: Capacitors - MLCC; Supplier Part Number 1: C3012378; Tolerance: ±10%; Voltage Rating: 6.3V; Temperature Coefficient: X5R; RoHS: Yes; ComponentLink1Description: Datasheet; ComponentLink1URL: https://wmsc.lcsc.com/wmsc/upload/file/pdf/v2/lcsc/2206071716_HRE-CSA0402X5R105K6R3GT_C3012378.pdf; ComponentLink2Description: JLCPCB Part URL; ComponentLink2URL: https://jlcpcb.com/partdetail/C3012378; ComponentLink3Description: LCSC Part URL; ComponentLink3URL: https://lcsc.com/product-detail/Multilayer-Ceramic-Capacitors-MLCC---SMD-SMT_HRE-HRE-CSA0402X5R105K6R3GT_C3012378.html
footprint CAP-0402 (0402 (1005M) Capacitor)
pins: 1, 2

## CSA0402X7R101K500GT
designator C?  Capacitance: 100pF  (hidden comment: *)
Capacitor, Ceramic (MLCC), 100pF, ±10%, 50V, X7R, ±10%, SMD 0402; Manufacturer: HRE; Manufacturer Part Number: CSA0402X7R101K500GT; Package Size: 0402; JLCPCB Basic Part: No; JLCPCB Part Number: C3012373; Supplier 1: LCSC; Category: Capacitors - MLCC; Supplier Part Number 1: C3012373; Tolerance: ±10%; Voltage Rating: 50V; Temperature Coefficient: X7R; RoHS: Yes; ComponentLink1Description: Datasheet; ComponentLink1URL: https://wmsc.lcsc.com/wmsc/upload/file/pdf/v2/lcsc/2206071716_HRE-CSA0402X7R101K500GT_C3012373.pdf; ComponentLink2Description: JLCPCB Part URL; ComponentLink2URL: https://jlcpcb.com/partdetail/C3012373; ComponentLink3Description: LCSC Part URL; ComponentLink3URL: https://lcsc.com/product-detail/Multilayer-Ceramic-Capacitors-MLCC---SMD-SMT_HRE-HRE-CSA0402X7R101K500GT_C3012373.html
footprint CAP-0402 (0402 (1005M) Capacitor)
pins: 1, 2

## CSA0402X7R102K500GT
designator C?  Capacitance: 1nF  (hidden comment: *)
Capacitor, Ceramic (MLCC), 1nF, ±10%, 50V, X7R, ±10%, SMD 0402; Manufacturer: HRE; Manufacturer Part Number: CSA0402X7R102K500GT; Package Size: 0402; JLCPCB Basic Part: No; JLCPCB Part Number: C3012374; Supplier 1: LCSC; Category: Capacitors - MLCC; Supplier Part Number 1: C3012374; Tolerance: ±10%; Voltage Rating: 50V; Temperature Coefficient: X7R; RoHS: Yes; ComponentLink1Description: Datasheet; ComponentLink1URL: https://wmsc.lcsc.com/wmsc/upload/file/pdf/v2/lcsc/2206071700_HRE-CSA0402X7R102K500GT_C3012374.pdf; ComponentLink2Description: JLCPCB Part URL; ComponentLink2URL: https://jlcpcb.com/partdetail/C3012374; ComponentLink3Description: LCSC Part URL; ComponentLink3URL: https://lcsc.com/product-detail/Multilayer-Ceramic-Capacitors-MLCC---SMD-SMT_HRE-HRE-CSA0402X7R102K500GT_C3012374.html
footprint CAP-0402 (0402 (1005M) Capacitor)
pins: 1, 2

## CSA0402X7R103K500GT
designator C?  Capacitance: 10nF  (hidden comment: *)
Capacitor, Ceramic (MLCC), 10nF, ±10%, 50V, X7R, ±10%, SMD 0402; Manufacturer: HRE; Manufacturer Part Number: CSA0402X7R103K500GT; Package Size: 0402; JLCPCB Basic Part: No; JLCPCB Part Number: C3012375; Supplier 1: LCSC; Category: Capacitors - MLCC; Supplier Part Number 1: C3012375; Tolerance: ±10%; Voltage Rating: 50V; Temperature Coefficient: X7R; RoHS: Yes; ComponentLink1Description: Datasheet; ComponentLink1URL: https://wmsc.lcsc.com/wmsc/upload/file/pdf/v2/lcsc/2206071716_HRE-CSA0402X7R103K500GT_C3012375.pdf; ComponentLink2Description: JLCPCB Part URL; ComponentLink2URL: https://jlcpcb.com/partdetail/C3012375; ComponentLink3Description: LCSC Part URL; ComponentLink3URL: https://lcsc.com/product-detail/Multilayer-Ceramic-Capacitors-MLCC---SMD-SMT_HRE-HRE-CSA0402X7R103K500GT_C3012375.html
footprint CAP-0402 (0402 (1005M) Capacitor)
pins: 1, 2

## CSA0402X7R104K160GT
designator C?  Capacitance: 100nF  (hidden comment: *)
Capacitor, Ceramic (MLCC), 100nF, ±10%, 16V, X7R, ±10%, SMD 0402; Manufacturer: HRE; Manufacturer Part Number: CSA0402X7R104K160GT; Package Size: 0402; JLCPCB Basic Part: No; JLCPCB Part Number: C3012376; Supplier 1: LCSC; Category: Capacitors - MLCC; Supplier Part Number 1: C3012376; Tolerance: ±10%; Voltage Rating: 16V; Temperature Coefficient: X7R; RoHS: Yes; ComponentLink1Description: Datasheet; ComponentLink1URL: https://wmsc.lcsc.com/wmsc/upload/file/pdf/v2/lcsc/2206071716_HRE-CSA0402X7R104K160GT_C3012376.pdf; ComponentLink2Description: JLCPCB Part URL; ComponentLink2URL: https://jlcpcb.com/partdetail/C3012376; ComponentLink3Description: LCSC Part URL; ComponentLink3URL: https://lcsc.com/product-detail/Multilayer-Ceramic-Capacitors-MLCC---SMD-SMT_HRE-HRE-CSA0402X7R104K160GT_C3012376.html
footprint CAP-0402 (0402 (1005M) Capacitor)
pins: 1, 2

## CSA0402X7R104K250GT
designator C?  Capacitance: 100nF  (hidden comment: *)
Capacitor, Ceramic (MLCC), 100nF, 25V, X7R, SMD 0402; Manufacturer: HRE; Manufacturer Part Number: CSA0402X7R104K250GT; Package Size: 0402; JLCPCB Basic Part: No; JLCPCB Part Number: C3015120; Supplier 1: LCSC; Category: Capacitors - MLCC; Supplier Part Number 1: C3015120; Voltage Rating: 25V; Temperature Coefficient: X7R; RoHS: Yes; ComponentLink1Description: Datasheet; ComponentLink1URL: https://wmsc.lcsc.com/wmsc/upload/file/pdf/v2/lcsc/2208051100_HRE-CSA0402X7R104K250GT_C3015120.pdf; ComponentLink2Description: JLCPCB Part URL; ComponentLink2URL: https://jlcpcb.com/partdetail/C3015120; ComponentLink3Description: LCSC Part URL; ComponentLink3URL: https://lcsc.com/product-detail/Multilayer-Ceramic-Capacitors-MLCC---SMD-SMT_HRE-HRE-CSA0402X7R104K250GT_C3015120.html
footprint CAP-0402 (0402 (1005M) Capacitor)
pins: 1, 2

## CSA0402X7R104K500GT
designator C?  Capacitance: 100nF  (hidden comment: *)
Capacitor, Ceramic (MLCC), 100nF, ±10%, 50V, X7R, ±10%, SMD 0402; Manufacturer: HRE; Manufacturer Part Number: CSA0402X7R104K500GT; Package Size: 0402; JLCPCB Basic Part: No; JLCPCB Part Number: C3012377; Supplier 1: LCSC; Category: Capacitors - MLCC; Supplier Part Number 1: C3012377; Tolerance: ±10%; Voltage Rating: 50V; Temperature Coefficient: X7R; RoHS: Yes; ComponentLink1Description: Datasheet; ComponentLink1URL: https://wmsc.lcsc.com/wmsc/upload/file/pdf/v2/lcsc/2206071716_HRE-CSA0402X7R104K500GT_C3012377.pdf; ComponentLink2Description: JLCPCB Part URL; ComponentLink2URL: https://jlcpcb.com/partdetail/C3012377; ComponentLink3Description: LCSC Part URL; ComponentLink3URL: https://lcsc.com/product-detail/Multilayer-Ceramic-Capacitors-MLCC---SMD-SMT_HRE-HRE-CSA0402X7R104K500GT_C3012377.html
footprint CAP-0402 (0402 (1005M) Capacitor)
pins: 1, 2

## CT05X5R106M06AH055
designator C?  Capacitance: 10uF  (hidden comment: *)
Capacitor, Ceramic (MLCC), 10uF, ±20%, 6.3V, X5R, ±20%, SMD 0402; Manufacturer: Kyocera; Manufacturer Part Number: CT05X5R106M06AH055; Package Size: 0402; JLCPCB Basic Part: No; JLCPCB Part Number: C510630; Supplier 1: LCSC; Category: Capacitors - MLCC; Supplier Part Number 1: C510630; Tolerance: ±20%; Voltage Rating: 6.3V; Temperature Coefficient: X5R; RoHS: Yes; ComponentLink1Description: Datasheet; ComponentLink1URL: https://wmsc.lcsc.com/wmsc/upload/file/pdf/v2/lcsc/2004071831_Kyocera-AVX-CT05X5R106M06AH055_C510630.pdf; ComponentLink2Description: JLCPCB Part URL; ComponentLink2URL: https://jlcpcb.com/partdetail/C510630; ComponentLink3Description: LCSC Part URL; ComponentLink3URL: https://lcsc.com/product-detail/Multilayer-Ceramic-Capacitors-MLCC---SMD-SMT_Kyocera-AVX-Kyocera-AVX-CT05X5R106M06AH055_C510630.html
footprint CAP-0402 (0402 (1005M) Capacitor)
pins: 1, 2

## CT41G-0402-2X1-16V-0_1_F-K_N_
designator C?  Capacitance: 100nF  (hidden comment: *)
Capacitor, Ceramic (MLCC), 100nF, ±10%, 16V, 2X1, ±10%, SMD 0402; Manufacturer: TORCH; Manufacturer Part Number: CT41G-0402-2X1-16V-0.1μF-K(N); Package Size: 0402; JLCPCB Basic Part: No; JLCPCB Part Number: C141382; Supplier 1: LCSC; Category: Capacitors - MLCC; Supplier Part Number 1: C141382; Tolerance: ±10%; Voltage Rating: 16V; Temperature Coefficient: 2X1; RoHS: Yes; ComponentLink1Description: Datasheet; ComponentLink1URL: https://wmsc.lcsc.com/wmsc/upload/file/pdf/v2/lcsc/2304140030_TORCH-CT41G-0402-2X1-16V-0-1-F-K-N_C141382.pdf; ComponentLink2Description: JLCPCB Part URL; ComponentLink2URL: https://jlcpcb.com/partdetail/C141382; ComponentLink3Description: LCSC Part URL; ComponentLink3URL: https://lcsc.com/product-detail/Multilayer-Ceramic-Capacitors-MLCC---SMD-SMT_TORCH-TORCH-CT41G-0402-2X1-16V-0.1%CE%BCF-KN_C141382.html
footprint CAP-0402 (0402 (1005M) Capacitor)
pins: 1, 2

## EDK105BBJ475MVLF
designator C?  Capacitance: 4.7uF  (hidden comment: *)
Capacitor, Ceramic (MLCC), 4.7uF, ±20%, 16V, ±20%, SMD 0402; Manufacturer: Taiyo Yuden; Manufacturer Part Number: EDK105BBJ475MVLF; Package Size: 0402; JLCPCB Basic Part: No; JLCPCB Part Number: C412302; Supplier 1: LCSC; Category: Capacitors - MLCC; Supplier Part Number 1: C412302; Tolerance: ±20%; Voltage Rating: 16V; RoHS: Yes; ComponentLink1Description: Datasheet; ComponentLink1URL: https://wmsc.lcsc.com/wmsc/upload/file/pdf/v2/lcsc/2207181700_Taiyo-Yuden-EDK105BBJ475MVLF_C412302.pdf; ComponentLink2Description: JLCPCB Part URL; ComponentLink2URL: https://jlcpcb.com/partdetail/C412302; ComponentLink3Description: LCSC Part URL; ComponentLink3URL: https://lcsc.com/product-detail/Multilayer-Ceramic-Capacitors-MLCC---SMD-SMT_Taiyo-Yuden-Taiyo-Yuden-EDK105BBJ475MVLF_C412302.html
footprint CAP-0402 (0402 (1005M) Capacitor)
pins: 1, 2